# Altium footprint library ESP32 WROVER Breakout.PcbLib: 2 footprints
Each footprint in its own frame and in the unit in brackets; x right, y up, seen from the top. Pads: shape width x height; smd on the part's side, far side on the other; paste and mask are expansions set on the pad; w line width, h text height; cw(c..) or ccw(c..) is an arc to the next point about the centre after c.
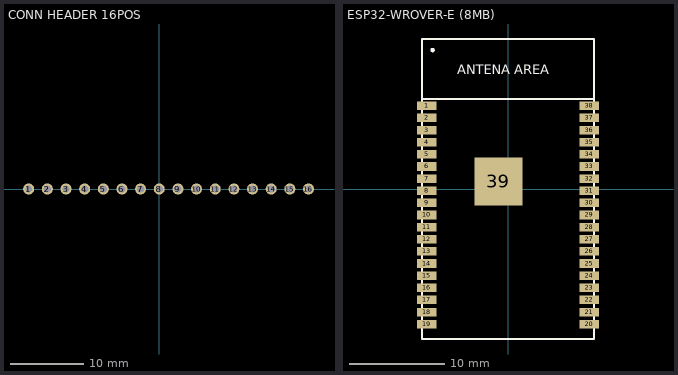
[diagram p0: the footprints below, top view; thin cyan lines are the x and y axes]

## CONN HEADER 16POS [mm]
pads (16):
  round 1.5 hole 0.9: 1(-17.78,0)
  round 1.5 hole 1.02: 2(-15.24,0) 3(-12.7,0) 4(-10.16,0) 5(-7.62,0) 6(-5.08,0) 7(-2.54,0) 8(0,0) 9(2.54,0) 10(5.08,0) 11(7.62,0) 12(10.16,0) 13(12.7,0) 14(15.24,0) 15(17.78,0) 16(20.32,0)
Bottom Overlay:
  lines w0.2: -19.1,-1.35 21.75,-1.35 21.75,1.351 -19.1,1.35 -19.1,-1.35
3D body "1248124_1-826629-6.stp": height 2.7, standoff -10, extent -18.99,-1.25 21.65,1.25

## ESP32-WROVER-E (8MB) [mm]
pads (39):
  rect 2x0.9 smd: 1(-8.5,8.71) 2(-8.5,7.44) 3(-8.5,6.17) 4(-8.5,4.9) 5(-8.5,3.63) 6(-8.5,2.36) 7(-8.5,1.09) 8(-8.5,-0.18) 9(-8.5,-1.45) 10(-8.5,-2.72) 11(-8.5,-3.99) 12(-8.5,-5.26) 13(-8.5,-6.53) 14(-8.5,-7.8) 15(-8.5,-9.07) 16(-8.5,-10.34) 17(-8.5,-11.61) 18(-8.5,-12.88) 19(-8.5,-14.15) 20(8.5,-14.15) 21(8.5,-12.88) 22(8.5,-11.61) 23(8.5,-10.34) 24(8.5,-9.07) 25(8.5,-7.8) 26(8.5,-6.53) 27(8.5,-5.26) 28(8.5,-3.99) 29(8.5,-2.72) 30(8.5,-1.45) 31(8.5,-0.18) 32(8.5,1.09) 33(8.5,2.36) 34(8.5,3.63) 35(8.5,4.9) 36(8.5,6.17) 37(8.5,7.44) 38(8.5,8.71)
  rect 5x5 smd: 39(-1,0.79)
Top Overlay:
  lines w0.2: -9,9.4 9,9.4 ; -9,-15.7 9,-15.7 9,15.7 -9,15.7 -9,-15.7
  lines w0.254: -7.808,14.592 ccw(c-7.893,14.54) -7.8,14.574
  text "ANTENA AREA" at -5.289,11.995 h1
3D body "ESP32-S2-WROVER.STEP": height 2.9, standoff -0.01, extent -8.247,-15 9.747,16
3D body "ESP32-WROVER-B.STEP": height 3.3, standoff 0, extent -8.953,-15.693 9.047,15.707